# Altium footprint library 集大电协1.5.PcbLib: 227 footprints (part 6 of 18) (continued)
## LOGO-Commit [mm] (continued)
5.563,-1.651 ; 5.055,-1.6 5.563,-1.6 ; 5.055,-1.549 5.563,-1.549 ; 5.055,-1.499 5.563,-1.499 ; 5.055,-1.448 5.563,-1.448 ; 5.055,-1.397 5.563,-1.397 ; 5.055,-1.346 5.563,-1.346

## LOGO_Buletooth [mm]
Top Layer:
  lines w0.025: -1.321,-0.406 -0.686,-0.406 ; -1.321,-0.381 -0.66,-0.381 ; -1.321,-0.356 -0.635,-0.356 ; -1.321,-0.33 -0.61,-0.33 ; -1.321,-0.305 -0.584,-0.305 ; -1.321,-0.279 -0.559,-0.279 ; -1.321,-0.254 -0.533,-0.254 ; -1.321,-0.229 -0.508,-0.229 ; -1.321,-0.203 -0.483,-0.203 ; -1.321,-0.178 -0.457,-0.178 ; -1.321,-0.152 -0.432,-0.152 ; -1.321,-0.127 -0.406,-0.127 ; -1.321,-0.102 -0.381,-0.102 ; -1.321,-0.076 -0.356,-0.076 ; -1.321,-0.051 -0.33,-0.051 ; -1.321,-0.025 -0.305,-0.025 ; -1.321,0 -0.279,0 ; -1.321,0.025 -0.254,0.025 ; -1.321,0.051 -0.229,0.051 ; -1.321,0.076 -0.203,0.076 ; -1.321,0.102 -0.178,0.102 ; -1.321,0.127 -0.178,0.127 ; -1.321,0.152 -0.203,0.152 ; -1.321,0.178 -0.229,0.178 ; -1.321,0.203 -0.254,0.203 ; -1.321,0.229 -0.279,0.229 ; -1.321,0.254 -0.305,0.254 ; -1.321,0.279 -0.33,0.279 ; -1.321,0.305 -0.356,0.305 ; -1.321,0.33 -0.381,0.33 ; -1.321,0.356 -0.406,0.356 ; -1.321,0.381 -0.432,0.381 ; -1.321,0.406 -0.457,0.406 ; -1.321,0.432 -0.483,0.432 ; -1.321,0.457 -0.508,0.457 ; -1.321,0.483 -0.533,0.483 ; -1.321,0.508 -0.559,0.508 ; -1.321,0.533 -0.584,0.533 ; -1.321,0.559 -0.61,0.559 ; -1.295,-0.584 -0.762,-0.584 ; -1.295,-0.559 -0.787,-0.559 ; -1.295,-0.533 -0.813,-0.533 ; -1.295,-0.508 -0.787,-0.508 ; -1.295,-0.483 -0.762,-0.483 ; -1.295,-0.457 -0.737,-0.457 ; -1.295,-0.432 -0.711,-0.432 ; -1.295,0.584 -0.635,0.584 ; -1.295,0.61 -0.66,0.61 ; -1.295,0.635 -0.686,0.635 ; -1.295,0.66 -0.711,0.66 ; -1.295,0.686 -0.737,0.686 ; -1.295,0.711 -0.762,0.711 ; -1.295,0.737 -0.787,0.737 ; -1.295,0.762 -0.787,0.762 ; -1.295,0.787 -0.762,0.787 ; -1.295,0.813 -0.737,0.813 ; -1.295,0.838 -0.711,0.838 ; -1.295,0.864 -0.686,0.864 ; -1.27,-0.711 -0.102,-0.711 ; -1.27,-0.686 -0.66,-0.686 ; -1.27,-0.66 -0.686,-0.66 ; -1.27,-0.635 -0.711,-0.635 ; -1.27,-0.61 -0.737,-0.61 ; -1.27,0.889 -0.66,0.889 ; -1.27,0.914 -0.102,0.914 ; -1.27,0.94 -0.102,0.94 ; -1.27,0.965 -0.102,0.965 ; -1.27,0.991 -0.102,0.991 ; -1.27,1.016 -0.102,1.016 ; -1.27,1.041 -0.102,1.041 ; -1.245,-0.813 -0.102,-0.813 ; -1.245,-0.787 -0.102,-0.787 ; -1.245,-0.762 -0.102,-0.762 ; -1.245,-0.737 -0.102,-0.737 ; -1.245,1.067 -0.102,1.067 ; -1.245,1.092 -0.102,1.092 ; -1.245,1.118 -0.102,1.118 ; -1.245,1.143 -0.102,1.143 ; -1.219,-0.889 -0.102,-0.889 ; -1.219,-0.864 -0.102,-0.864 ; -1.219,-0.838 -0.102,-0.838 ; -1.219,1.168 -0.102,1.168 ; -1.219,1.194 -0.102,1.194 ; -1.219,1.219 -0.102,1.219 ; -1.194,-0.965 -0.102,-0.965 ; -1.194,-0.94 -0.102,-0.94 ; -1.194,-0.914 -0.102,-0.914 ; -1.194,1.245 -0.102,1.245 ; -1.194,1.27 -0.102,1.27 ; -1.194,1.295 -0.102,1.295 ; -1.168,-1.016 -0.102,-1.016 ; -1.168,-0.991 -0.102,-0.991 ; -1.168,1.321 -0.102,1.321 ; -1.168,1.346 -0.102,1.346 ; -1.143,-1.067 -0.102,-1.067 ; -1.143,-1.041 -0.102,-1.041 ; -1.143,1.372 -0.102,1.372 ; -1.143,1.397 -0.102,1.397 ; -1.118,-1.118 -0.102,-1.118 ; -1.118,-1.092 -0.102,-1.092 ; -1.118,1.422 -0.102,1.422 ; -1.092,-1.168 -0.102,-1.168 ; -1.092,-1.143 -0.102,-1.143 ; -1.092,1.448 -0.102,1.448 ; -1.092,1.473 -0.102,1.473 ; -1.067,-1.194 -0.102,-1.194 ; -1.067,1.499 -0.102,1.499 ; -1.041,-1.245 -0.102,-1.245 ; -1.041,-1.219 -0.102,-1.219 ; -1.041,1.524 -0.102,1.524 ; -1.016,-1.27 -0.102,-1.27 ; -1.016,1.549 -0.102,1.549 ; -1.016,1.575 -0.102,1.575 ; -0.991,-1.295 -0.102,-1.295 ; -0.965,-1.321 -0.102,-1.321 ; -0.965,1.6 0.914,1.6 ; -0.94,-1.372 -0.102,-1.372 ; -0.94,-1.346 -0.102,-1.346 ; -0.94,1.626 0.864,1.626 ; -0.914,-1.397 0.864,-1.397 ; -0.914,1.651 0.838,1.651 ; -0.889,1.676 0.813,1.676 ; -0.864,-1.422 0.838,-1.422 ; -0.864,1.702 0.787,1.702 ; -0.838,-1.448 0.813,-1.448 ; -0.813,-1.473 0.762,-1.473 ; -0.813,1.727 0.737,1.727 ; -0.787,-1.499 0.737,-1.499 ; -0.762,1.753 0.711,1.753 ; -0.737,-1.524 0.686,-1.524 ; -0.711,1.778 0.66,1.778 ; -0.686,-1.549 0.635,-1.549 ; -0.66,1.803 0.584,1.803 ; -0.635,-1.575 0.584,-1.575 ; -0.635,-0.686 -0.102,-0.686 ; -0.61,-0.66 -0.102,-0.66 ; -0.61,0.889 -0.102,0.889 ; -0.61,1.829 0.533,1.829 ; -0.584,-1.6 0.508,-1.6 ; -0.584,-0.635 -0.102,-0.635 ; -0.584,0.864 -0.102,0.864 ; -0.559,-0.61 -0.102,-0.61 ; -0.559,0.838 -0.102,0.838 ; -0.533,-1.626 0.432,-1.626 ; -0.533,-0.584 -0.102,-0.584 ; -0.533,0.813 -0.102,0.813 ; -0.508,-0.559 -0.102,-0.559 ; -0.508,0.787 -0.102,0.787 ; -0.508,1.854 0.432,1.854 ; -0.483,-0.533 -0.102,-0.533 ; -0.483,0.762 -0.102,0.762 ; -0.457,-0.508 -0.102,-0.508 ; -0.457,0.737 -0.102,0.737 ; -0.432,-1.651 0.33,-1.651 ; -0.432,-0.483 -0.102,-0.483 ; -0.432,0.711 -0.102,0.711 ; -0.406,-0.457 -0.102,-0.457 ; -0.406,0.686 -0.102,0.686 ; -0.381,-0.432 -0.102,-0.432 ; -0.381,0.66 -0.102,0.66 ; -0.381,1.88 0.33,1.88 ; -0.356,-0.406 -0.102,-0.406 ; -0.356,0.635 -0.102,0.635 ; -0.33,-0.381 -0.102,-0.381 ; -0.33,0.61 -0.102,0.61 ; -0.305,-1.676 0.178,-1.676 ; -0.305,-0.356 -0.102,-0.356 ; -0.305,0.584 -0.102,0.584 ; -0.279,-0.33 -0.102,-0.33 ; -0.279,0.559 -0.102,0.559 ; -0.254,-0.305 -0.102,-0.305 ; -0.254,0.533 -0.102,0.533 ; -0.229,-0.279 -0.102,-0.279 ; -0.229,0.508 -0.102,0.508 ; -0.203,-0.254 -0.102,-0.254 ; -0.203,0.483 -0.102,0.483 ; -0.203,1.905 0.127,1.905 ; -0.178,-0.229 -0.102,-0.229 ; -0.178,0.457 -0.102,0.457 ; -0.152,-0.203 -0.102,-0.203 ; -0.152,0.432 -0.102,0.432 ; -0.127,0.406 -0.102,0.406 ; -0.076,-1.372 0.889,-1.372 ; -0.076,1.575 0.94,1.575 ; -0.051,-1.346 0.914,-1.346 ; -0.051,1.549 0.965,1.549 ; -0.025,-1.321 0.94,-1.321 ; -0.025,1.524 0.965,1.524 ; 0,-1.295 0.965,-1.295 ; 0,1.499 0.991,1.499 ; 0.025,-1.27 0.991,-1.27 ; 0.025,1.473 1.016,1.473 ; 0.051,-1.245 1.016,-1.245 ; 0.051,1.448 1.041,1.448 ; 0.076,-1.219 1.016,-1.219 ; 0.076,1.422 1.041,1.422 ; 0.102,-1.194 1.041,-1.194 ; 0.102,-0.813 0.152,-0.813 ; 0.102,-0.787 0.178,-0.787 ; 0.102,-0.762 0.203,-0.762 ; 0.102,-0.737 0.229,-0.737 ; 0.102,-0.711 0.254,-0.711 ; 0.102,-0.686 0.279,-0.686 ; 0.102,-0.66 0.305,-0.66 ; 0.102,-0.635 0.33,-0.635 ; 0.102,-0.61 0.356,-0.61 ; 0.102,-0.584 0.381,-0.584 ; 0.102,-0.559 0.406,-0.559 ; 0.102,-0.533 0.432,-0.533 ; 0.102,-0.508 0.457,-0.508 ; 0.102,-0.483 0.457,-0.483 ; 0.102,-0.457 0.432,-0.457 ; 0.102,-0.432 0.406,-0.432 ; 0.102,-0.406 0.381,-0.406 ; 0.102,-0.381 0.356,-0.381 ; 0.102,-0.356 0.33,-0.356 ; 0.102,-0.33 0.305,-0.33 ; 0.102,-0.305 0.279,-0.305 ; 0.102,-0.279 0.254,-0.279 ; 0.102,-0.254 0.229,-0.254 ; 0.102,-0.229 0.203,-0.229 ; 0.102,-0.203 0.178,-0.203 ; 0.102,-0.178 0.152,-0.178 ; 0.102,0.406 0.127,0.406 ; 0.102,0.432 0.178,0.432 ; 0.102,0.457 0.203,0.457 ; 0.102,0.483 0.229,0.483 ; 0.102,0.508 0.254,0.508 ; 0.102,0.533 0.279,0.533 ; 0.102,0.559 0.305,0.559 ; 0.102,0.584 0.33,0.584 ; 0.102,0.61 0.356,0.61 ; 0.102,0.635 0.381,0.635 ; 0.102,0.66 0.406,0.66 ; 0.102,0.686 0.432,0.686 ; 0.102,0.711 0.457,0.711 ; 0.102,0.737 0.457,0.737 ; 0.102,0.762 0.432,0.762 ; 0.102,0.787 0.406,0.787 ; 0.102,0.813 0.381,0.813 ; 0.102,0.838 0.356,0.838 ; 0.102,0.864 0.33,0.864 ; 0.102,0.889 0.305,0.889 ; 0.102,0.914 0.279,0.914 ; 0.102,0.94 0.254,0.94 ; 0.102,0.965 0.229,0.965 ; 0.102,0.991 0.203,0.991 ; 0.102,1.016 0.178,1.016 ; 0.102,1.041 0.152,1.041 ; 0.102,1.397 1.067,1.397 ; 0.127,-1.168 1.067,-1.168 ; 0.127,1.372 1.092,1.372 ; 0.152,-1.143 1.067,-1.143 ; 0.152,1.346 1.092,1.346 ; 0.178,-1.118 1.092,-1.118 ; 0.178,0.102 1.372,0.102 ; 0.178,0.127 1.372,0.127 ; 0.178,1.321 1.118,1.321 ; 0.203,-1.092 1.118,-1.092 ; 0.203,0.076 1.372,0.076 ; 0.203,0.152 1.372,0.152 ; 0.203,1.295 1.118,1.295 ; 0.229,-1.067 1.118,-1.067 ; 0.229,0.051 1.372,0.051 ; 0.229,0.178 1.372,0.178 ; 0.229,1.27 1.143,1.27 ; 0.254,-1.041 1.143,-1.041 ; 0.254,0.025 1.372,0.025 ; 0.254,0.203 1.372,0.203 ; 0.254,1.245 1.143,1.245 ; 0.279,-1.016 1.143,-1.016 ; 0.279,0 1.372,0 ; 0.279,0.229 1.372,0.229 ; 0.279,1.219 1.168,1.219 ; 0.305,-0.991 1.168,-0.991 ; 0.305,-0.025 1.372,-0.025 ; 0.305,0.254 1.372,0.254 ; 0.305,1.194 1.168,1.194 ; 0.33,-0.965 1.168,-0.965 ; 0.33,-0.051 1.372,-0.051 ; 0.33,0.279 1.372,0.279 ; 0.33,1.168 1.194,1.168 ; 0.356,-0.94 1.168,-0.94 ; 0.356,-0.076 1.372,-0.076 ; 0.356,0.305 1.372,0.305 ; 0.356,1.143 1.194,1.143 ; 0.381,-0.914 1.194,-0.914 ; 0.381,-0.102 1.372,-0.102 ; 0.381,0.33 1.372,0.33 ; 0.406,-0.889 1.194,-0.889 ; 0.406,-0.127 1.372,-0.127 ; 0.406,0.356 1.372,0.356 ; 0.406,1.118 1.194,1.118 ; 0.432,-0.864 1.194,-0.864 ; 0.432,-0.152 1.346,-0.152 ; 0.432,0.381 1.372,0.381 ; 0.432,1.092 1.219,1.092 ; 0.457,-0.838 1.219,-0.838 ; 0.457,-0.178 1.346,-0.178 ; 0.457,0.406 1.372,0.406 ; 0.457,1.067 1.219,1.067 ; 0.483,-0.813 1.219,-0.813 ; 0.483,-0.203 1.346,-0.203 ; 0.483,0.432 1.372,0.432 ; 0.483,1.041 1.245,1.041 ; 0.508,-0.787 1.219,-0.787 ; 0.508,-0.229 1.346,-0.229 ; 0.508,0.457 1.372,0.457 ; 0.508,1.016 1.245,1.016 ; 0.533,-0.762 1.245,-0.762 ; 0.533,-0.254 1.346,-0.254 ; 0.533,0.483 1.372,0.483 ; 0.533,0.991 1.245,0.991 ; 0.559,-0.737 1.245,-0.737 ; 0.559,-0.279 1.346,-0.279 ; 0.559,0.508 1.346,0.508 ; 0.559,0.965 1.27,0.965 ; 0.584,-0.711 1.245,-0.711 ; 0.584,-0.305 1.346,-0.305 ; 0.584,0.533 1.346,0.533 ; 0.584,0.94 1.27,0.94 ; 0.61,-0.686 1.27,-0.686 ; 0.61,-0.33 1.346,-0.33 ; 0.61,0.559 1.346,0.559 ; 0.61,0.914 1.27,0.914 ; 0.635,-0.66 1.27,-0.66 ; 0.635,-0.356 1.321,-0.356 ; 0.635,0.584 1.346,0.584 ; 0.635,0.889 1.27,0.889 ; 0.66,-0.635 1.27,-0.635 ; 0.66,-0.381 1.321,-0.381 ; 0.66,0.61 1.346,0.61 ; 0.66,0.864 1.295,0.864 ; 0.686,-0.61 1.27,-0.61 ; 0.686,-0.406 1.321,-0.406 ; 0.686,0.635 1.346,0.635 ; 0.686,0.838 1.295,0.838 ; 0.711,-0.584 1.27,-0.584 ; 0.711,-0.432 1.321,-0.432 ; 0.711,0.66 1.346,0.66 ; 0.711,0.813 1.295,0.813 ; 0.737,-0.559 1.295,-0.559 ; 0.737,-0.457 1.321,-0.457 ; 0.737,0.686 1.321,0.686 ; 0.737,0.787 1.321,0.787 ; 0.762,-0.533 1.295,-0.533 ; 0.762,-0.483 1.295,-0.483 ; 0.762,0.711 1.321,0.711 ; 0.762,0.762 1.321,0.762 ; 0.787,-0.508 1.295,-0.508 ; 0.787,0.737 1.321,0.737

## LOGO_Buzzer [mm]
Top Layer:
  lines w0.025: -1.88,-0.787 1.118,-0.787 ; -1.88,-0.762 1.118,-0.762 ; -1.88,-0.737 1.118,-0.737 ; -1.88,-0.711 1.118,-0.711 ; -1.88,-0.686 1.118,-0.686 ; -1.88,-0.66 1.118,-0.66 ; -1.88,-0.635 1.118,-0.635 ; -1.88,-0.61 1.118,-0.61 ; -1.88,-0.584 1.118,-0.584 ; -1.88,-0.559 1.118,-0.559 ; -1.88,-0.533 1.118,-0.533 ; -1.88,-0.508 1.118,-0.508 ; -1.88,-0.483 1.118,-0.483 ; -1.88,-0.457 1.118,-0.457 ; -1.88,-0.432 1.118,-0.432 ; -1.88,-0.406 1.118,-0.406 ; -1.88,-0.381 1.118,-0.381 ; -1.88,-0.356 1.118,-0.356 ; -1.88,-0.33 1.118,-0.33 ; -1.88,-0.305 1.118,-0.305 ; -1.88,-0.279 1.118,-0.279 ; -1.88,-0.254 1.118,-0.254 ; -1.88,-0.229 1.118,-0.229 ; -1.88,-0.203 1.118,-0.203 ; -1.88,-0.178 1.118,-0.178 ; -1.88,-0.152 1.118,-0.152 ; -1.88,-0.127 1.118,-0.127 ; -1.88,-0.102 1.118,-0.102 ; -1.88,-0.076 1.118,-0.076 ; -1.88,-0.051 1.118,-0.051 ; -1.88,-0.025 1.118,-0.025 ; -1.88,0 1.118,0 ; -1.88,0.025 1.118,0.025 ; -1.88,0.051 1.118,0.051 ; -1.88,0.076 1.118,0.076 ; -1.88,0.102 1.118,0.102 ; -1.88,0.127 1.118,0.127 ; -1.88,0.152 1.118,0.152 ; -1.88,0.178 1.118,0.178 ; -1.88,0.203 1.118,0.203 ; -1.88,0.229 1.118,0.229 ; -1.88,0.254 1.118,0.254 ; -1.88,0.279 1.118,0.279 ; -1.88,0.305 1.118,0.305 ; -1.88,0.33 1.118,0.33 ; -1.88,0.356 1.118,0.356 ; -1.88,0.381 1.118,0.381 ; -1.88,0.406 1.118,0.406 ; -1.88,0.432 1.118,0.432 ; -1.88,0.457 1.118,0.457 ; -1.88,0.483 1.118,0.483 ; -1.88,0.508 1.118,0.508 ; -1.88,0.533 1.118,0.533 ; -1.88,0.559 1.118,0.559 ; -1.88,0.584 1.118,0.584 ; -1.88,0.61 1.118,0.61 ; -1.88,0.635 1.118,0.635 ; -1.88,0.66 1.118,0.66 ; -1.88,0.686 1.118,0.686 ; -1.88,0.711 1.118,0.711 ; -1.88,0.737 1.118,0.737 ; -1.88,0.762 1.118,0.762 ; -1.88,0.787 1.118,0.787 ; -1.88,0.813 1.118,0.813 ; -1.88,0.838 1.118,0.838 ; -1.88,0.864 1.118,0.864 ; -1.854,-0.813 1.118,-0.813 ; -1.854,0.889 1.118,0.889 ; -1.829,-0.838 1.118,-0.838 ; -1.829,0.914 1.118,0.914 ; -1.803,-0.864 1.118,-0.864 ; -1.803,0.94 1.118,0.94 ; -1.778,-0.889 1.118,-0.889 ; -1.727,0.965 1.118,0.965 ; -0.965,-0.914 1.118,-0.914 ; -0.889,0.991 1.118,0.991 ; -0.838,-0.94 1.118,-0.94 ; -0.813,1.016 1.118,1.016 ; -0.787,-0.965 1.118,-0.965 ; -0.762,1.041 1.118,1.041 ; -0.737,-0.991 1.118,-0.991 ; -0.737,1.067 1.118,1.067 ; -0.711,-1.016 1.118,-1.016 ; -0.711,1.092 1.118,1.092 ; -0.686,-1.041 1.118,-1.041 ; -0.686,1.118 1.118,1.118 ; -0.66,-1.067 1.118,-1.067 ; -0.66,1.143 1.118,1.143 ; -0.635,-1.092 1.118,-1.092 ; -0.635,1.168 1.118,1.168 ; -0.584,-1.118 1.118,-1.118 ; -0.584,1.194 1.118,1.194 ; -0.559,-1.143 1.118,-1.143 ; -0.559,1.219 1.118,1.219 ; -0.533,-1.168 1.118,-1.168 ; -0.533,1.245 1.118,1.245 ; -0.483,-1.194 1.118,-1.194 ; -0.483,1.27 1.118,1.27 ; -0.457,-1.219 1.118,-1.219 ; -0.457,1.295 1.118,1.295 ; -0.406,-1.245 1.118,-1.245 ; -0.406,1.321 1.118,1.321 ; -0.381,-1.27 1.118,-1.27 ; -0.381,1.346 1.118,1.346 ; -0.356,-1.295 1.118,-1.295 ; -0.33,1.372 1.118,1.372 ; -0.305,-1.321 1.118,-1.321 ; -0.305,1.397 1.118,1.397 ; -0.279,-1.346 1.118,-1.346 ; -0.254,1.422 1.118,1.422 ; -0.229,-1.372 1.118,-1.372 ; -0.203,-1.397 1.118,-1.397 ; -0.203,1.448 1.118,1.448 ; -0.178,1.473 1.118,1.473 ; -0.152,-1.422 1.118,-1.422 ; -0.127,1.499 1.118,1.499 ; -0.102,-1.448 1.118,-1.448 ; -0.102,1.524 1.118,1.524 ; -0.076,-1.473 1.118,-1.473 ; -0.051,1.549 1.118,1.549 ; -0.025,-1.499 1.118,-1.499 ; -0.025,1.575 1.118,1.575 ; 0,-1.524 1.118,-1.524 ; 0.025,1.6 1.118,1.6 ; 0.051,-1.549 1.118,-1.549 ; 0.076,-1.575 1.118,-1.575 ; 0.076,1.626 1.118,1.626 ; 0.102,1.651 1.118,1.651 ; 0.127,-1.6 1.118,-1.6 ; 0.152,1.676 1.118,1.676 ; 0.178,-1.626 1.118,-1.626 ; 0.178,1.702 1.118,1.702 ; 0.203,-1.651 1.118,-1.651 ; 0.229,-1.676 1.118,-1.676 ; 0.229,1.727 1.118,1.727 ; 0.254,1.753 1.118,1.753 ; 0.279,-1.702 1.118,-1.702 ; 0.305,1.778 1.118,1.778 ; 0.33,-1.727 1.118,-1.727 ; 0.33,1.803 1.118,1.803 ; 0.356,-1.753 1.118,-1.753 ; 0.381,1.829 1.118,1.829 ; 0.406,-1.778 1.118,-1.778 ; 0.406,1.854 1.118,1.854 ; 0.432,-1.803 1.118,-1.803 ; 0.457,1.88 1.118,1.88 ; 0.483,-1.829 1.118,-1.829 ; 0.508,-1.854 1.118,-1.854 ; 0.508,1.905 1.118,1.905 ; 0.533,1.93 1.118,1.93 ; 0.559,-1.88 1.118,-1.88 ; 0.584,-1.905 1.118,-1.905 ; 0.584,1.956 1.118,1.956 ; 0.61,1.981 1.118,1.981 ; 0.635,-1.93 1.118,-1.93 ; 0.635,2.007 1.118,2.007 ; 0.66,-1.956 1.118,-1.956 ; 0.686,2.032 1.118,2.032 ; 0.711,-1.981 1.118,-1.981 ; 0.711,2.057 1.092,2.057 ; 0.737,-2.007 1.092,-2.007 ; 0.737,2.083 1.092,2.083 ; 0.762,2.108 1.092,2.108 ; 0.787,-2.032 1.092,-2.032 ; 0.813,-2.057 1.067,-2.057 ; 0.813,2.134 1.067,2.134 ; 0.864,-2.083 1.067,-2.083 ; 0.864,2.159 1.041,2.159 ; 0.914,2.184 1.016,2.184 ; 0.94,-2.108 1.016,-2.108 ; 1.549,-1.219 2.159,-1.219 ; 1.549,-1.194 2.134,-1.194 ; 1.549,-1.168 2.108,-1.168 ; 1.549,-1.143 2.083,-1.143 ; 1.549,-1.118 2.057,-1.118 ; 1.549,-1.092 2.007,-1.092 ; 1.549,1.245 2.083,1.245 ; 1.549,1.27 2.108,1.27 ; 1.549,1.295 2.134,1.295 ; 1.575,-1.27 2.21,-1.27 ; 1.575,-1.245 2.184,-1.245 ; 1.575,-1.067 1.981,-1.067 ; 1.575,-1.041 1.956,-1.041 ; 1.575,-1.016 1.93,-1.016 ; 1.575,1.168 1.981,1.168 ; 1.575,1.194 2.032,1.194 ; 1.575,1.219 2.057,1.219 ; 1.575,1.321 2.159,1.321 ; 1.575,1.346 2.21,1.346 ; 1.575,1.372 2.235,1.372 ; 1.6,-1.295 2.261,-1.295 ; 1.6,-0.991 1.905,-0.991 ; 1.6,1.118 1.93,1.118 ; 1.6,1.143 1.956,1.143 ; 1.6,1.397 2.261,1.397 ; 1.626,-1.321 2.286,-1.321 ; 1.626,-0.965 1.88,-0.965 ; 1.626,-0.94 1.829,-0.94 ; 1.626,1.067 1.88,1.067 ; 1.626,1.092 1.905,1.092 ; 1.626,1.422 2.286,1.422 ; 1.651,-1.346 2.311,-1.346 ; 1.651,1.041 1.829,1.041 ; 1.651,1.448 2.311,1.448 ; 1.676,-1.372 2.337,-1.372 ; 1.676,-0.914 1.803,-0.914 ; 1.676,1.473 2.337,1.473 ; 1.702,-1.397 2.362,-1.397 ; 1.702,1.016 1.803,1.016 ; 1.702,1.499 2.362,1.499 ; 1.727,-1.422 2.388,-1.422 ; 1.727,1.524 2.413,1.524 ; 1.753,-1.448 2.438,-1.448 ; 1.778,0 3.175,0 ; 1.778,0.025 3.175,0.025 ; 1.778,0.051 3.175,0.051 ; 1.778,0.076 3.175,0.076 ; 1.778,0.102 3.175,0.102 ; 1.778,0.127 3.175,0.127 ; 1.778,1.549 2.438,1.549 ; 1.803,-1.473 2.464,-1.473 ; 1.803,-0.076 3.15,-0.076 ; 1.803,-0.051 3.15,-0.051 ; 1.803,-0.025 3.175,-0.025 ; 1.803,0.152 3.15,0.152 ; 1.803,0.178 3.15,0.178 ; 1.803,1.575 2.464,1.575 ; 1.829,-1.499 2.489,-1.499 ; 1.829,-0.102 3.124,-0.102 ; 1.829,0.203 3.124,0.203 ; 1.829,1.6 2.489,1.6 ; 1.854,-1.524 2.515,-1.524 ; 1.854,-0.127 3.099,-0.127 ; 1.854,0.229 3.124,0.229 ; 1.854,1.626 2.515,1.626 ; 1.88,-1.549 2.54,-1.549 ; 1.88,-0.152 3.048,-0.152 ; 1.88,0.254 3.073,0.254 ; 1.88,1.651 2.54,1.651 ; 1.905,-1.575 2.565,-1.575 ; 1.905,1.676 2.591,1.676 ; 1.93,-1.6 2.616,-1.6 ; 1.93,0.279 3.023,0.279 ; 1.956,1.702 2.616,1.702 ; 1.981,-1.626 2.642,-1.626 ; 1.981,1.727 2.642,1.727 ; 2.007,-1.651 2.642,-1.651 ; 2.007,1.753 2.667,1.753 ; 2.032,-1.676 2.667,-1.676 ; 2.032,1.778 2.692,1.778 ; 2.057,-1.702 2.667,-1.702 ; 2.057,1.803 2.692,1.803 ; 2.083,-1.727 2.692,-1.727 ; 2.083,1.829 2.692,1.829 ; 2.108,-1.753 2.692,-1.753 ; 2.134,1.854 2.718,1.854 ; 2.159,-1.778 2.692,-1.778 ; 2.159,1.88 2.718,1.88 ; 2.184,-1.803 2.692,-1.803 ; 2.184,1.905 2.718,1.905 ; 2.21,-1.829 2.692,-1.829 ; 2.21,1.93 2.718,1.93 ; 2.235,-1.854 2.692,-1.854 ; 2.235,1.956 2.692,1.956 ; 2.261,-1.88 2.667,-1.88 ; 2.261,1.981 2.692,1.981 ; 2.286,-1.905 2.667,-1.905 ; 2.311,2.007 2.692,2.007 ; 2.337,-1.93 2.667,-1.93 ; 2.337,2.032 2.667,2.032 ; 2.362,-1.956 2.642,-1.956 ; 2.362,2.057 2.667,2.057 ; 2.388,-1.981 2.616,-1.981 ; 2.388,2.083 2.642,2.083 ; 2.413,-2.007 2.591,-2.007 ; 2.413,2.108 2.616,2.108 ; 2.438,2.134 2.591,2.134 ; 2.464,-2.032 2.54,-2.032

## LOGO_Car [mm]
Top Layer:
  lines w0.025: -2.057,-0.254 2.184,-0.254 ; -2.057,-0.229 2.184,-0.229 ; -2.057,-0.203 2.184,-0.203 ; -2.057,-0.178 2.184,-0.178 ; -2.057,-0.152 2.159,-0.152 ; -2.057,-0.127 2.159,-0.127 ; -2.057,-0.102 2.159,-0.102 ; -2.057,-0.076 2.134,-0.076 ; -2.057,-0.051 2.134,-0.051 ; -2.057,-0.025 2.134,-0.025 ; -2.057,0 2.108,0 ; -2.057,0.025 2.108,0.025 ; -2.057,0.051 2.083,0.051 ; -2.057,0.076 2.083,0.076 ; -2.057,0.102 2.057,0.102 ; -2.032,-0.356 2.21,-0.356 ; -2.032,-0.33 2.21,-0.33 ; -2.032,-0.305 2.21,-0.305 ; -2.032,-0.279 2.21,-0.279 ; -2.032,0.127 2.057,0.127 ; -2.032,0.152 2.032,0.152 ; -2.032,0.178 2.032,0.178 ; -2.007,-0.432 2.21,-0.432 ; -2.007,-0.406 2.21,-0.406 ; -2.007,-0.381 2.21,-0.381 ; -2.007,0.203 2.007,0.203 ; -2.007,0.229 2.007,0.229 ; -1.981,-0.483 2.184,-0.483 ; -1.981,-0.457 2.21,-0.457 ; -1.981,0.254 1.981,0.254 ; -1.981,0.279 1.956,0.279 ; -1.956,-0.508 2.184,-0.508 ; -1.956,0.305 1.93,0.305 ; -1.93,-0.533 2.159,-0.533 ; -1.93,0.33 1.93,0.33 ; -1.905,-0.559 2.159,-0.559 ; -1.905,0.356 1.905,0.356 ; -1.88,-0.584 2.134,-0.584 ; -1.88,0.381 1.88,0.381 ; -1.854,-0.61 2.108,-0.61 ; -1.854,0.406 1.854,0.406 ; -1.829,-0.635 2.083,-0.635 ; -1.829,0.432 1.829,0.432 ; -1.803,0.457 1.803,0.457 ; -1.753,-0.66 2.057,-0.66 ; -1.753,0.483 1.778,0.483 ; -1.727,0.508 1.753,0.508 ; -1.702,-0.686 -0.889,-0.686 ; -1.676,-0.737 -0.914,-0.737 ; -1.676,-0.711 -0.889,-0.711 ; -1.676,0.533 1.727,0.533 ; -1.651,-0.762 -0.914,-0.762 ; -1.626,-0.787 -0.94,-0.787 ; -1.626,0.559 1.702,0.559 ; -1.6,-0.813 -0.965,-0.813 ; -1.575,-0.838 -0.991,-0.838 ; -1.575,0.584 1.702,0.584 ; -1.549,-0.864 -1.016,-0.864 ; -1.524,-0.889 -1.067,-0.889 ; -1.524,0.61 1.676,0.61 ; -1.473,-0.914 -1.092,-0.914 ; -1.473,0.635 -0.889,0.635 ; -1.397,-0.94 -1.168,-0.94 ; -1.397,0.66 -0.889,0.66 ; -1.321,0.686 -0.864,0.686 ; -1.219,0.711 -0.838,0.711 ; -1.168,0.737 -0.838,0.737 ; -1.143,0.762 -0.813,0.762 ; -1.143,0.787 -0.787,0.787 ; -1.118,0.813 -0.787,0.813 ; -1.118,0.838 -0.762,0.838 ; -1.092,0.864 -0.737,0.864 ; -1.067,0.889 -0.711,0.889 ; -1.067,0.914 -0.686,0.914 ; -1.041,0.94 -0.66,0.94 ; -1.016,0.965 -0.635,0.965 ; -0.991,0.991 -0.61,0.991 ; -0.991,1.016 -0.584,1.016 ; -0.965,1.041 -0.559,1.041 ; -0.94,1.067 -0.508,1.067 ; -0.914,1.092 -0.483,1.092 ; -0.889,1.118 -0.457,1.118 ; -0.864,1.143 -0.406,1.143 ; -0.864,1.168 -0.356,1.168 ; -0.838,1.194 -0.33,1.194 ; -0.813,1.219 -0.279,1.219 ; -0.762,1.245 -0.229,1.245 ; -0.737,1.27 -0.178,1.27 ; -0.711,1.295 -0.102,1.295 ; -0.686,1.321 -0.025,1.321 ; -0.66,1.346 0.025,1.346 ; -0.61,1.372 1.168,1.372 ; -0.584,1.397 1.118,1.397 ; -0.533,1.422 1.092,1.422 ; -0.483,1.448 1.041,1.448 ; -0.432,1.473 1.016,1.473 ; -0.406,1.499 0.965,1.499 ; -0.33,1.524 0.889,1.524 ; -0.279,1.549 0.838,1.549 ; -0.203,1.575 0.762,1.575 ; -0.127,1.6 0.635,1.6 ; 0.025,1.626 0.508,1.626 ; 0.102,0.635 0.406,0.635 ; 0.102,0.66 0.406,0.66 ; 0.102,0.686 0.406,0.686 ; 0.102,0.711 0.406,0.711 ; 0.102,0.737 0.406,0.737 ; 0.102,0.762 0.406,0.762 ; 0.102,0.787 0.406,0.787 ; 0.102,0.813 0.406,0.813 ; 0.102,0.838 0.406,0.838 ; 0.102,0.864 0.406,0.864 ; 0.102,0.889 0.406,0.889 ; 0.102,0.914 0.406,0.914 ; 0.102,0.94 0.406,0.94 ; 0.102,0.965 0.406,0.965 ; 0.102,0.991 0.406,0.991 ; 0.102,1.016 0.406,1.016 ; 0.102,1.041 0.406,1.041 ; 0.102,1.067 0.406,1.067 ; 0.102,1.092 0.406,1.092 ; 0.102,1.118 0.406,1.118 ; 0.102,1.143 0.406,1.143 ; 0.102,1.168 0.406,1.168 ; 0.102,1.194 0.406,1.194 ; 0.102,1.219 0.406,1.219 ; 0.102,1.245 0.406,1.245 ; 0.102,1.27 0.406,1.27 ; 0.102,1.295 0.406,1.295 ; 0.102,1.321 0.406,1.321 ; 0.102,1.346 0.406,1.346 ; 0.508,1.346 1.194,1.346 ; 0.635,1.321 1.219,1.321 ; 0.711,1.295 1.27,1.295 ; 0.762,1.27 1.295,1.27 ; 0.838,1.245 1.321,1.245 ; 0.889,1.219 1.321,1.219 ; 0.94,1.194 1.346,1.194 ; 0.991,1.168 1.372,1.168 ; 1.016,1.143 1.397,1.143 ; 1.041,1.118 1.422,1.118 ; 1.092,-0.711 1.905,-0.711 ; 1.092,-0.686 1.905,-0.686 ; 1.092,1.092 1.422,1.092 ; 1.118,-0.762 1.854,-0.762 ; 1.118,-0.737 1.88,-0.737 ; 1.118,1.067 1.448,1.067 ; 1.143,-0.787 1.854,-0.787 ; 1.143,1.041 1.473,1.041 ; 1.168,-0.813 1.829,-0.813 ; 1.168,1.016 1.473,1.016 ; 1.194,-0.838 1.803,-0.838 ; 1.194,0.991 1.499,0.991 ; 1.219,-0.864 1.778,-0.864 ; 1.219,0.94 1.524,0.94 ; 1.219,0.965 1.499,0.965 ; 1.245,-0.889 1.727,-0.889 ; 1.245,0.914 1.524,0.914 ; 1.27,0.864 1.549,0.864 ; 1.27,0.889 1.549,0.889 ; 1.295,-0.914 1.702,-0.914 ; 1.295,0.838 1.549,0.838 ; 1.321,0.787 1.575,0.787 ; 1.321,0.813 1.575,0.813 ; 1.346,0.737 1.6,0.737 ; 1.346,0.762 1.575,0.762 ; 1.372,-0.94 1.626,-0.94 ; 1.372,0.686 1.626,0.686 ; 1.372,0.711 1.6,0.711 ; 1.397,0.635 1.651,0.635 ; 1.397,0.66 1.626,0.66